# Altium footprint library biblioteka_pcb.PcbLib: 184 footprints (part 3 of 12)
Each footprint in its own frame and in the unit in brackets; x right, y up, seen from the top. Pads: shape width x height; smd on the part's side, far side on the other; paste and mask are expansions set on the pad; w line width, h text height; cw(c..) or ccw(c..) is an arc to the next point about the centre after c.
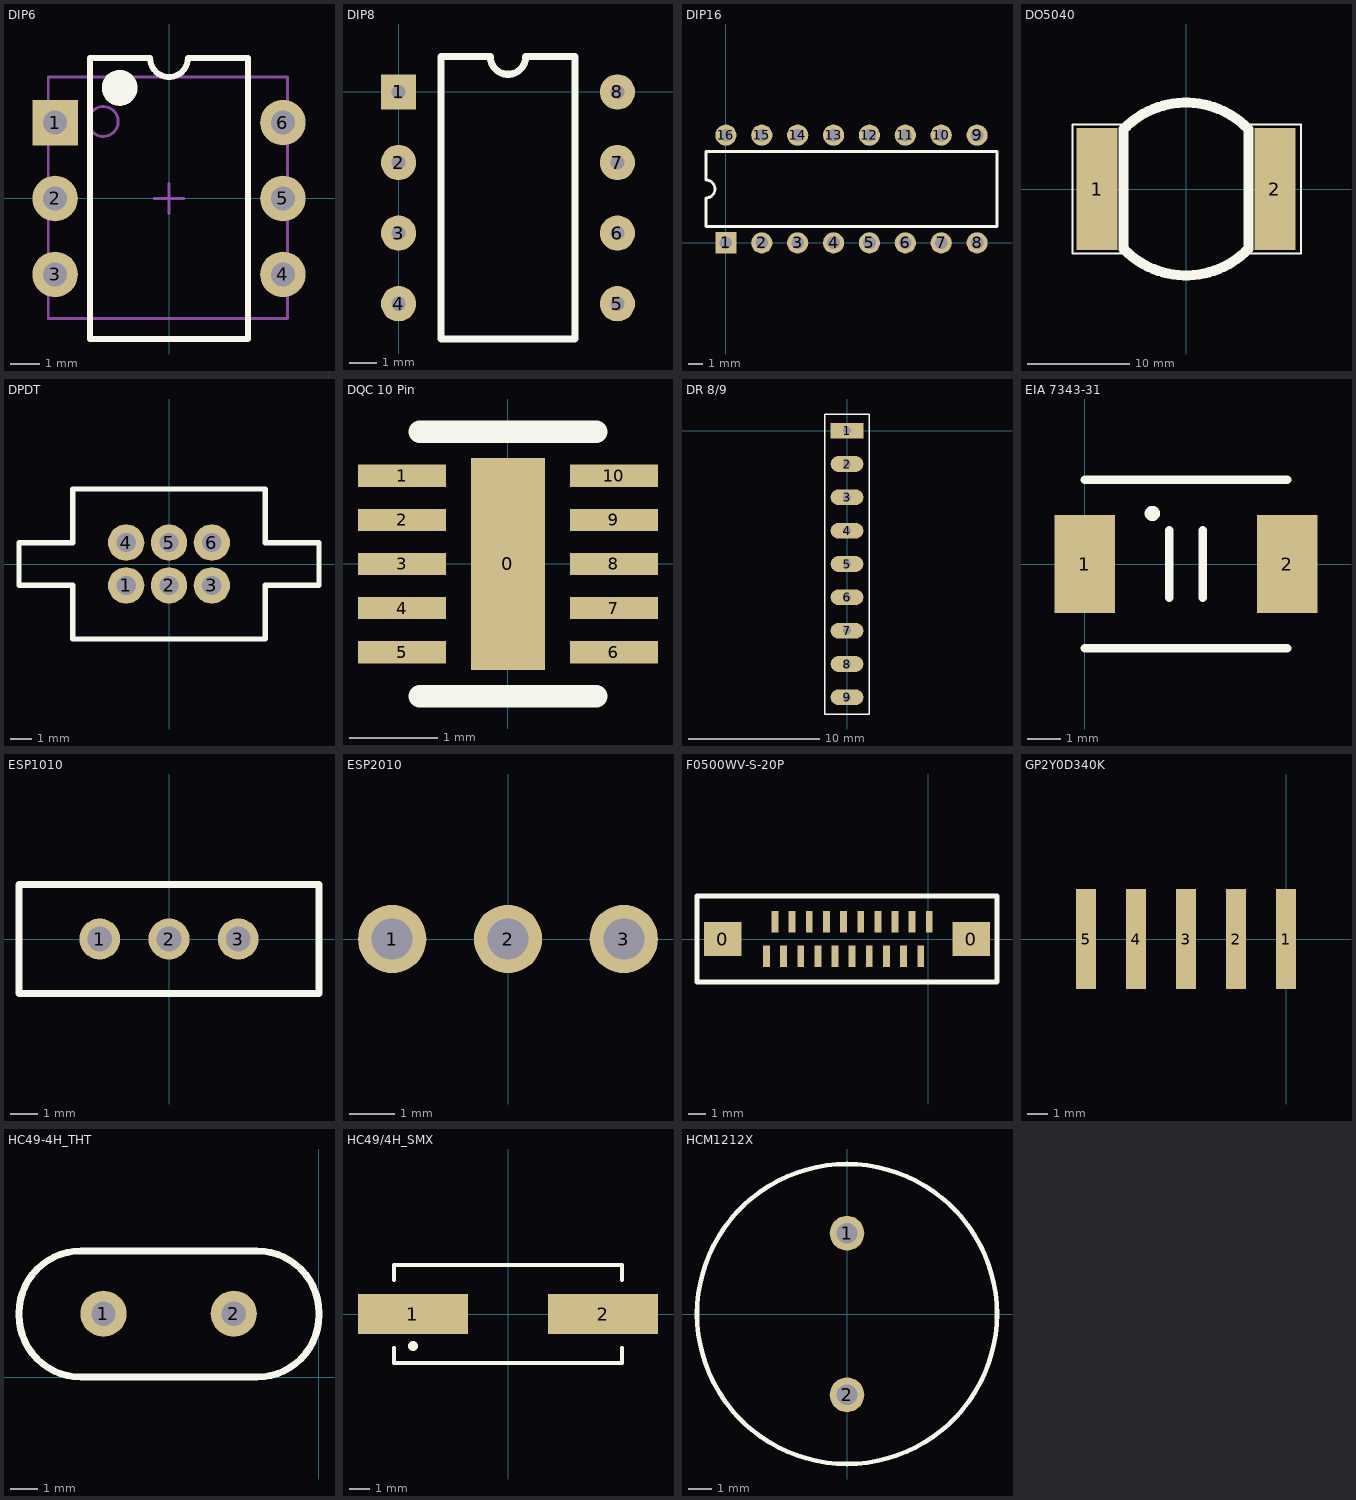
[diagram p2: the footprints below, top view; thin cyan lines are the x and y axes]

## DIP6 [mil] "DIP; 6 Leads; Row Spacing 7.62 mm; Pitch 2.54 mm"
height 214.96
pads (6):
  rect 60x60 hole 32 unplated: 1(-150,100)
  round 60 hole 32 unplated: 2(-150,0) 3(-150,-100) 4(150,-100) 5(150,0) 6(150,100)
Top Overlay:
  circle w23.62: c-64.96,145.67 r11.81
  lines w7.87: -104.33,-185.04 104.33,-185.04 104.33,185.04 25,185.04 cw(c0,185.04) -25,185.04 -104.33,185.04 -104.33,-185.04
Mechanical 13:
  circle w3.94: c-86.61,101.38 r19.68
  lines w3.94: -159.02,-158.03 -159.02,160.08 155.94,160.08 155.94,-158.03 -159.02,-158.03
Mechanical 15:
  lines w3.94: -19.68,0 19.68,0 ; 0,-19.68 0,19.68
3D body "DIP6.step": height 177.56, standoff -121.26, extent -159.02,-158.03 155.94,160.08

## DIP8 [mil]
pads (8):
  rect 50x50 hole 20: 1(0,0)
  round 50 hole 20: 2(0,-100) 3(0,-200) 4(0,-300) 5(310,-300) 6(310,-200) 7(310,-100) 8(310,0)
Top Overlay:
  lines w10: 60,-350 60,50 130,50 ccw(c155,50) 180,50 250,50 250,-350 60,-350
3D body "DIP8.stp": height 133.86, standoff -119.63, extent 5,-355.24 305,55

## DIP16 [mm]
pads (16):
  rect 1.5x1.5 hole 0.9: 1(0,0)
  round 1.5 hole 0.9: 2(2.54,0) 3(5.08,0) 4(7.62,0) 5(10.16,0) 6(12.7,0) 7(15.24,0) 8(17.78,0) 9(17.78,7.62) 10(15.24,7.62) 11(12.7,7.62) 12(10.16,7.62) 13(7.62,7.62) 14(5.08,7.62) 15(2.54,7.62) 16(0,7.62)
Top Overlay:
  lines w0.2: -1.41,1.16 19.19,1.16 19.19,6.46 -1.41,6.46 -1.41,4.445 cw(c-1.41,3.81) -1.41,3.175 -1.41,1.16
3D body "DIP16.stp": height 4.5, standoff -1.94, extent -1.38,-0.02 19.2,7.6

## DO5040 [mm]
pads (2):
  rect 4x12 smd: 1(-8.75,0) 2(8.75,0)
Top Overlay:
  lines w0.2: -5.969,-6.35 -11.176,-6.35 -11.176,6.35 -5.842,6.35 ; 5.588,-6.35 11.303,-6.35 11.303,6.35 6.096,6.35
  lines w1: -6.137,-5.874 ccw(c-6.119,-5.874) -6.132,-5.887 ccw(c0,0) 6.137,-5.881 cw(c6.149,-5.869) 6.132,-5.869 6.132,5.887 ccw(c0,0) -6.137,5.881 -6.137,-5.874
3D body "DO5040.stp": height 11.1, standoff 0, extent -9.906,-8.001 10.167,7.999

## DPDT [mm] "Double pole, double throw"
pads (6):
  round 1.7 hole 0.9: 1(-2,-1) 2(0,-1) 3(2,-1) 4(-2,1) 5(0,1) 6(2,1)
Top Overlay:
  lines w0.254: -7,-1 -4.5,-1 -4.5,-3.5 4.5,-3.5 4.5,-1 7,-1 7,1 4.5,1 4.5,3.5 -4.5,3.5 -4.5,1 -7,1 -7,-1
3D body "DPDT.stp": height 1.5, standoff -8.7, extent -6.775,-3.371 6.825,3.429

## DQC 10 Pin [mm]
pads (11):
  rect 0.84x2.4 smd: 0(0,0)
  rect 1x0.25 smd: 1(-1.2,1) 2(-1.2,0.5) 3(-1.2,0) 4(-1.2,-0.5) 5(-1.2,-1) 6(1.2,-1) 7(1.2,-0.5) 8(1.2,0) 9(1.2,0.5) 10(1.2,1)
Top Overlay:
  lines w0.254: -1,-1.5 1,-1.5 ; -1,1.5 1,1.5

## DR 8/9 [mm]
pads (9):
  rect 2.5x1.2 hole 0.6: 1(0,0)
  oval 2.5x1.2 hole 0.6: 2(0,-2.54) 3(0,-5.08) 4(0,-7.62) 5(0,-10.16) 6(0,-12.7) 7(0,-15.24) 8(0,-17.78) 9(0,-20.32)
Top Overlay:
  lines w0.1: -1.7,-21.59 1.7,-21.59 1.7,1.27 -1.7,1.27 -1.7,-21.59
3D body "DR 8na9.stp": height 4.7, standoff -2.9, extent -1.1,-21.7 1.1,1.3

## EDF27 [mm]
via 0,0 diameter 38 hole 36
3D body "EDF_27.stp": height 25.8, standoff 0, extent -18.35,-18.314 18.205,18.314

## EIA 7343-31 [mm]
pads (2):
  rect 1.8x2.9 smd: 1(0,0) 2(6,0)
Top Overlay:
  circle w0.254: c2,1.5 r0.1
  lines w0.254: 0,-2.5 6,-2.5 ; 0,2.5 6,2.5 ; 2.5,-1 2.5,1 ; 3.5,-1 3.5,1

## ESP1010 [mm] "ON - ON Switch tht vertical"
pads (3):
  round 1.5 hole 0.9: 1(-2.54,0) 2(0,0) 3(2.54,0)
Top Overlay:
  lines w0.254: -5.5,-2 -5.5,2 5.5,2 5.5,-2 -5.5,-2
3D body "Switch_SPDT_V.stp": height 6.8, standoff -1.5, extent -5,-1.255 5,1.245

## ESP2010 [mm] "ON - ON Switch tht"
pads (3):
  round 1.5 hole 0.9: 1(-2.54,0) 2(0,0) 3(2.54,0)
3D body "Switch_SPDT.stp": height 2.5, standoff -1.5, extent -5,-0.401 5,7.3

## F0500WV-S-20P [mm] "Z彻cze FFC 20 pin"
pads (22):
  rect 2.2x2 smd: 0(-12,0) 0(2.5,0)
  rect 0.4x1.25 smd: 1(-9.45,-1) 2(-8.95,1) 3(-8.45,-1) 4(-7.95,1) 5(-7.45,-1) 6(-6.95,1) 7(-6.45,-1) 8(-5.95,1) 9(-5.45,-1) 10(-4.95,1) 11(-4.45,-1) 12(-3.95,1) 13(-3.45,-1) 14(-2.95,1) 15(-2.45,-1) 16(-1.95,1) 17(-1.45,-1) 18(-0.95,1) 19(-0.45,-1) 20(0.05,1)
Top Overlay:
  lines w0.3: -13.5,-2.5 4,-2.5 4,2.5 -13.5,2.5 -13.5,-2.5

## GP2Y0D340K [mm]
pads (5):
  rect 1x5 smd: 1(0,0) 2(-2.5,0) 3(-5,0) 4(-7.5,0) 5(-10,0)

## HC49-4H_THT [mm] "HC49-4H package for oscillator"
pads (2):
  round 1.7 hole 0.9: 1(-7.938,2.337) 2(-3.138,2.337)
Top Overlay:
  lines w0.254: -11.05,2.286 ccw(c-8.764,2.286) -8.764,0 -2.286,0 ccw(c-2.286,2.286) 0,2.286 ; -11.05,2.364 cw(c-8.764,2.364) -8.764,4.65 -2.286,4.65 cw(c-2.286,2.364) 0,2.364
3D body "HC49-4H.stp": height 3.5, standoff -1.5, extent -11.113,0 -0.063,4.65

## HC49/4H_SMX [mm]
pads (2):
  rect 5.5x2 smd: 1(-4.75,0) 2(4.75,0)
Top Overlay:
  circle w0.25: c-4.75,-1.6 r0.125
  lines w0.2: -5.7,-1.7 -5.7,-2.45 5.7,-2.45 5.7,-1.7 ; -5.7,1.7 -5.7,2.45 5.7,2.45 5.7,1.7
3D body "XTAL_SMD.stp": height 3.9, standoff 0, extent -6.3,-2.3 6.2,2.35

## HCM1212X [mm] "Buzzer"
pads (2):
  round 1.5 hole 0.9: 1(0,3.5) 2(0,-3.5)
Top Overlay:
  circle w0.2: c0,0 r6.5
3D body "HCM1212X.stp": height 9.01, standoff -2, extent -5.98,-6 5.98,6